# Altium footprint library 04.连接器件.pcb.PCBLIB: 363 footprints (part 15 of 23)
Each footprint in its own frame and in the unit in brackets; x right, y up, seen from the top. Pads: shape width x height; smd on the part's side, far side on the other; paste and mask are expansions set on the pad; w line width, h text height; cw(c..) or ccw(c..) is an arc to the next point about the centre after c.
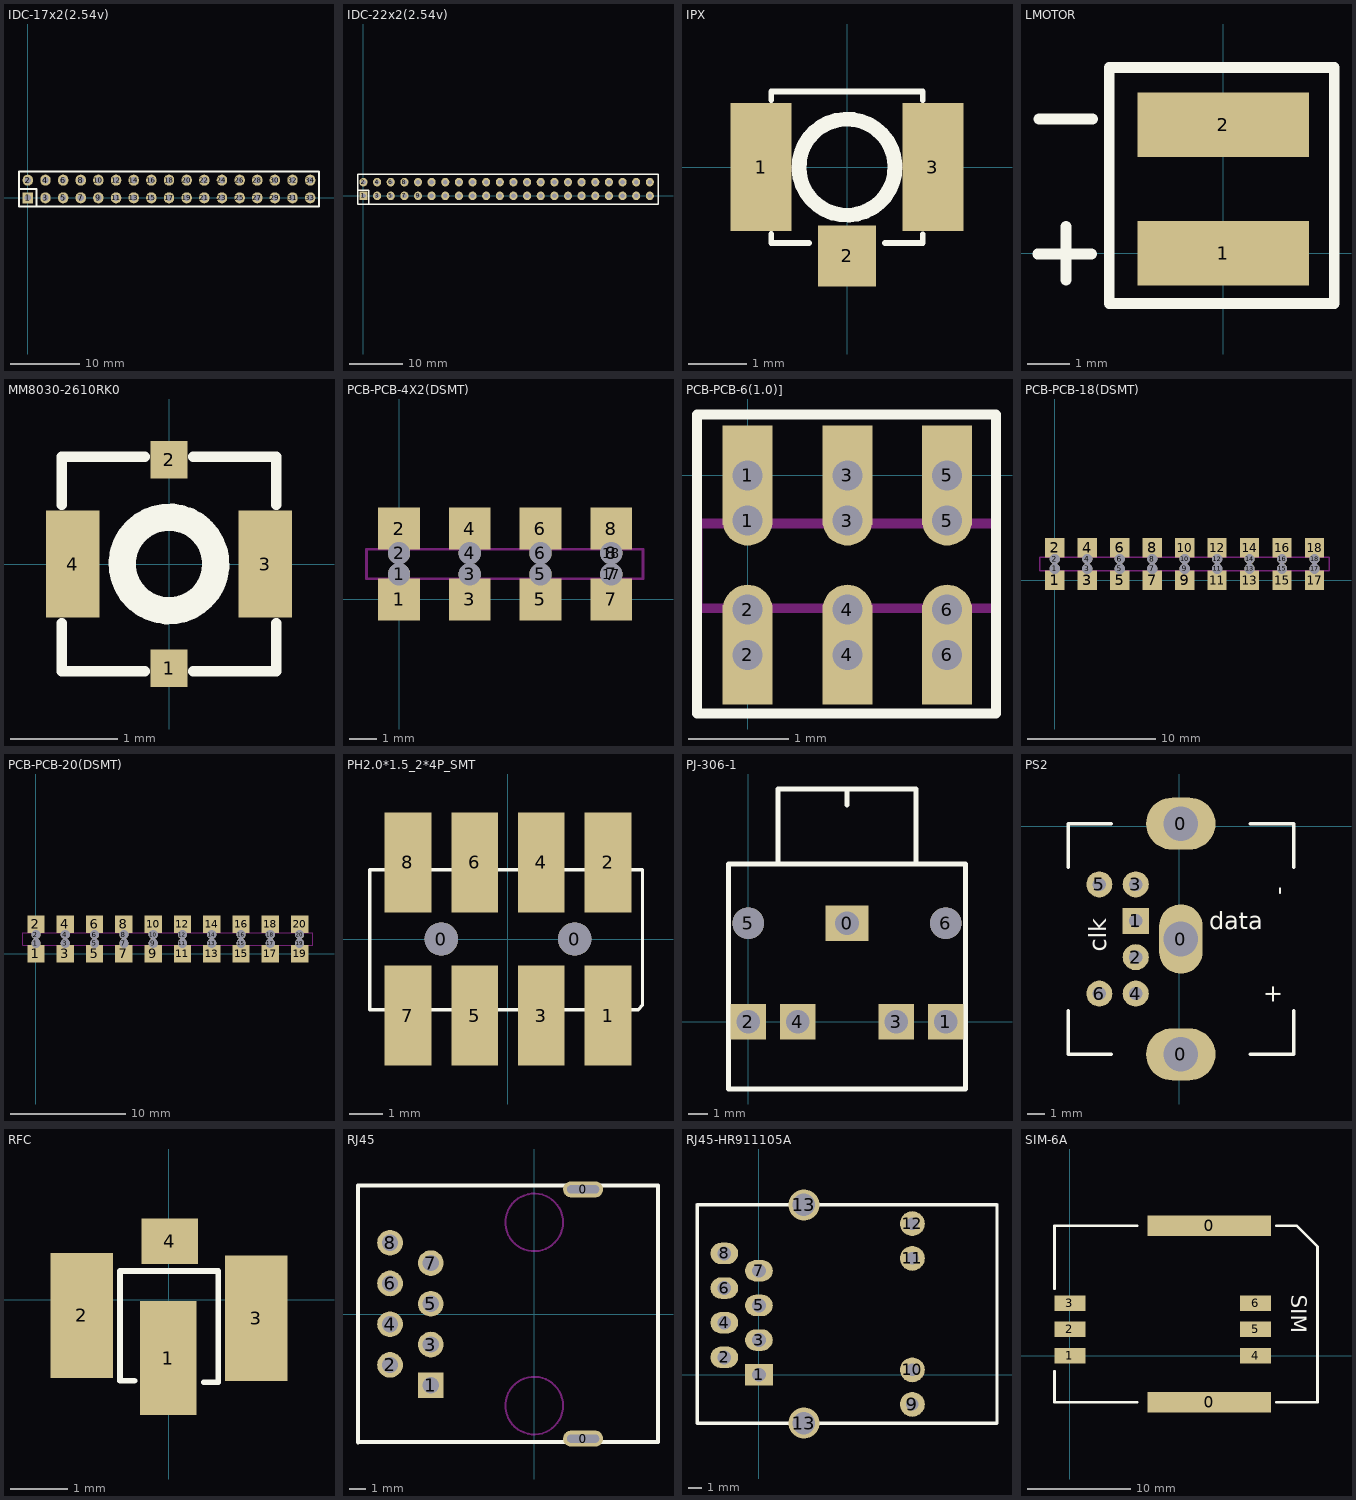
[diagram p14: the footprints below, top view; thin cyan lines are the x and y axes]

## IDC-17x2(2.54v) [mm]
pads (34):
  rect 1.5x1.6 hole 0.9: 1(0,0)
  oval 1.5x1.6 hole 0.9: 2(0,2.54) 3(2.54,0) 4(2.54,2.54) 5(5.08,0) 6(5.08,2.54) 7(7.62,0) 8(7.62,2.54) 9(10.16,0) 10(10.16,2.54) 11(12.7,0) 12(12.7,2.54) 13(15.24,0) 14(15.24,2.54) 15(17.78,0) 16(17.78,2.54) 17(20.32,0) 18(20.32,2.54) 19(22.86,0) 20(22.86,2.54) 21(25.4,0) 22(25.4,2.54) 23(27.94,0) 24(27.94,2.54) 25(30.48,0) 26(30.48,2.54) 27(33.02,0) 28(33.02,2.54) 29(35.56,0) 30(35.56,2.54) 31(38.1,0) 32(38.1,2.54) 33(40.64,0) 34(40.64,2.54)
TopOverlay:
  lines w0.305: -1.27,1.27 1.27,1.27 1.27,-1.27 ; -1.27,-1.27 41.91,-1.27 41.91,3.81 -1.27,3.81 -1.27,-1.27

## IDC-22x2(2.54v) [mm]
pads (44):
  rect 1.5x1.6 hole 0.9: 1(0,0)
  oval 1.5x1.6 hole 0.9: 2(0,2.54) 3(2.54,0) 4(2.54,2.54) 5(5.08,0) 6(5.08,2.54) 7(7.62,0) 8(7.62,2.54) 9(10.16,0) 10(10.16,2.54) 11(12.7,0) 12(12.7,2.54) 13(15.24,0) 14(15.24,2.54) 15(17.78,0) 16(17.78,2.54) 17(20.32,0) 18(20.32,2.54) 19(22.86,0) 20(22.86,2.54) 21(25.4,0) 22(25.4,2.54) 23(27.94,0) 24(27.94,2.54) 25(30.48,0) 26(30.48,2.54) 27(33.02,0) 28(33.02,2.54) 29(35.56,0) 30(35.56,2.54) 31(38.1,0) 32(38.1,2.54) 33(40.64,0) 34(40.64,2.54) 35(43.18,0) 36(43.18,2.54) 37(45.72,0) 38(45.72,2.54) 39(48.26,0) 40(48.26,2.54) 41(50.8,0) 42(50.8,2.54) 43(53.34,0) 44(53.34,2.54)
TopOverlay:
  lines w0.254: -1.016,1.016 1.016,1.016 ; -1.016,-1.524 54.864,-1.524 54.864,3.556 54.864,4.064 -1.016,4.064 -1.016,-1.524
  lines w0.305: 1.016,-1.524 1.016,1.016

## IPX [mm]
pads (3):
  rect 1.05x2.2 smd: 1(-1.475,0) 3(1.475,0)
  rect 1x1.05 smd: 2(0,-1.525)
TopOverlay:
  lines w0.1: -1.3,-1.15 -1.3,-1.3 -0.65,-1.3 ; -1.3,1.151 -1.3,1.3 1.3,1.3 1.3,1.15 ; 0.65,-1.3 1.3,-1.3 1.3,-1.151
  lines w0.254: 0.824,0.029 cw(c0,0) 0.824,0.042

## LMOTOR [mm]
pads (2):
  rect 4x1.5 smd: 1(0,0) 2(0,3)
TopOverlay:
  lines w0.254: -4.323,-0.016 -3.073,-0.016 ; -4.298,3.134 -3.048,3.134 ; -3.662,-0.624 -3.662,0.626 ; -2.656,-1.168 2.594,-1.168 2.594,4.332 -2.656,4.332 -2.656,4.082 -2.656,-1.168

## MM8030-2610RK0 [mm] "蓝牙卡扣MM8030-2610RK0"
pads (4):
  rect 0.35x0.35 smd: 1(0,-0.975) 2(0,0.975)
  rect 0.5x1 smd: 3(0.9,0) 4(-0.9,0)
TopOverlay:
  lines w0.1: -1,-0.552 -1,-1 -0.225,-1 ; -1,0.554 -1,1 -0.226,1 ; 0.226,1 1,1 1,0.553 ; 0.227,-1 1,-1 1,-0.552
  lines w0.254: -0.427,0.093 ccw(c0,0) -0.422,0.112

## PCB-PCB-4X2(DSMT) [mm]
pads (18):
  rect 1.5x1.5 all layers, no hole: 1(0,0) 2(0,2.54) 3(2.54,0) 4(2.54,2.54) 5(5.08,0) 6(5.08,2.54) 7(7.62,0) 8(7.62,2.54)
  round 0.8 hole 0.8: 1(0,0.9) 2(0,1.66) 3(2.54,0.9) 4(2.54,1.66) 5(5.08,0.9) 6(5.08,1.66) 7(7.62,0.9) 8(7.62,1.66) 17(7.62,0.9) 18(7.62,1.66)
BottomOverlay:
  lines w0.1: -1.473,-1.27 9.3,-1.27 9.3,3.81 -1.473,3.81 -1.473,-1.27
KeepOutLayer:
  lines w0.1: -0.914,1.803 8.255,1.803 ; -0.889,0.737 8.331,0.737 ; -0.025,0.737 -1.168,0.737 -1.168,1.803 -0.025,1.803 ; 7.62,0.737 8.763,0.737 8.763,1.803 7.62,1.803

## PCB-PCB-6(1.0)] [mm]
pads (12):
  round 0.5 hole 0.3: 1(0,-0.454) 2(0,-1.346) 3(1,-0.454) 4(1,-1.346) 5(2,-0.454) 6(2,-1.346)
  rect 0.5x1 hole 0.3: 1(0,0) 2(0,-1.8) 3(1,0) 4(1,-1.8) 5(2,0) 6(2,-1.8)
TopOverlay:
  lines w0.1: -0.508,-2.388 2.489,-2.388 2.489,0.61 -0.508,0.61 -0.508,-2.388
KeepOutLayer:
  lines w0.1: 2.489,-1.333 -0.503,-1.333 -0.503,-0.483 2.489,-0.483 ; 2.489,-1.321 2.489,-0.471

## PCB-PCB-18(DSMT) [mm]
pads (36):
  rect 1.5x1.5 all layers, no hole: 1(0,0) 2(0,2.54) 3(2.54,0) 4(2.54,2.54) 5(5.08,0) 6(5.08,2.54) 7(7.62,0) 8(7.62,2.54) 9(10.16,0) 10(10.16,2.54) 11(12.7,0) 12(12.7,2.54) 13(15.24,0) 14(15.24,2.54) 15(17.78,0) 16(17.78,2.54) 17(20.32,0) 18(20.32,2.54)
  round 0.8 hole 0.8: 1(0,0.9) 2(0,1.66) 3(2.54,0.9) 4(2.54,1.66) 5(5.08,0.9) 6(5.08,1.66) 7(7.62,0.9) 8(7.62,1.66) 9(10.16,0.9) 10(10.16,1.66) 11(12.7,0.9) 12(12.7,1.66) 13(15.24,0.9) 14(15.24,1.66) 15(17.78,0.9) 16(17.78,1.66) 17(20.32,0.9) 18(20.32,1.66)
BottomOverlay:
  lines w0.2: -1.473,-1.27 22,-1.27 22,3.81 -1.473,3.81 -1.473,-1.27
KeepOutLayer:
  lines w0.1: -1.168,0.737 -0.025,0.737 20.32,0.737 21.463,0.737 21.463,1.803 20.32,1.803 -0.025,1.803 -1.168,1.803 -1.168,0.737

## PCB-PCB-20(DSMT) [mm]
pads (40):
  rect 1.5x1.5 all layers, no hole: 1(0,0) 2(0,2.54) 3(2.54,0) 4(2.54,2.54) 5(5.08,0) 6(5.08,2.54) 7(7.62,0) 8(7.62,2.54) 9(10.16,0) 10(10.16,2.54) 11(12.7,0) 12(12.7,2.54) 13(15.24,0) 14(15.24,2.54) 15(17.78,0) 16(17.78,2.54) 17(20.32,0) 18(20.32,2.54) 19(22.86,0) 20(22.86,2.54)
  round 0.8 hole 0.8: 1(0,0.9) 2(0,1.66) 3(2.54,0.9) 4(2.54,1.66) 5(5.08,0.9) 6(5.08,1.66) 7(7.62,0.9) 8(7.62,1.66) 9(10.16,0.9) 10(10.16,1.66) 11(12.7,0.9) 12(12.7,1.66) 13(15.24,0.9) 14(15.24,1.66) 15(17.78,0.9) 16(17.78,1.66) 17(20.32,0.9) 18(20.32,1.66) 19(22.86,0.9) 20(22.86,1.66)
BottomOverlay:
  lines w0.2: -1.473,-1.27 24.54,-1.27 24.54,3.81 -1.473,3.81 -1.473,-1.27
KeepOutLayer:
  lines w0.1: -1.168,0.737 -1.168,1.803 2.515,1.803 22.86,1.803 24.003,1.803 24.003,0.737 22.86,0.737 -0.025,0.737 -1.168,0.737

## PH2.0*1.5_2*4P_SMT [mm] "HP2.0*1.5_2*4P_SMT_DA=3.2_DB=2.0_带定位柱_展开6.5"
pads (10):
  round 1 hole 1 unplated: 0(-2,0) 0(2,0)
  rect 1.4x3 smd: 1(3,-2.3) 2(3,2.3) 3(1,-2.3) 4(1,2.3) 5(-1,-2.3) 6(-1,2.3) 7(-3,-2.3) 8(-3,2.3)
TopOverlay:
  lines w0.1: 3.913,-2.118 -4.143,-2.118 -4.143,2.073 4.036,2.073 4.036,-1.994 ; 3.919,-2.107 4.033,-1.992
3D body "asm0001_asm.stp": height 5.2, standoff -0.7, extent -4.009,-3.266 3.99,3.234

## PJ-306-1 [mm]
pads (7):
  rect 2.2x1.8 hole 1.2: 0(5,5)
  rect 1.8x1.8 hole 1.2: 1(10,0) 2(0,0) 3(7.5,0) 4(2.5,0)
  round 1.6 hole 1.6 unplated: 5(0,5) 6(10,5)
TopOverlay:
  lines w0.254: 1.5,8 1.5,11.8 8.4,11.8 ; 5,11 5,11.8 ; 8.5,8 8.5,11.8 ; -1,-3.4 -1,8 11,8 11,-3.4 -1,-3.4
3D body "耳机.": height 3.2, standoff -10.8, extent -1.041,-3.689 11.059,11.411

## PS2 [mm]
pads (9):
  oval 4x3 hole 2: 0(0.092,-13.162) 0(0.092,0.138)
  oval 2.5x4 hole 2: 0(0.092,-6.512)
  rect 1.5x1.5 hole 0.762: 1(-2.508,-5.462)
  round 1.5 hole 0.762: 2(-2.508,-7.562) 3(-2.508,-3.362) 4(-2.508,-9.662) 5(-4.608,-3.362) 6(-4.608,-9.662)
TopOverlay:
  lines w0.2: -6.41,-10.662 -6.41,-13.162 -3.91,-13.162 ; -6.409,-2.363 -6.409,0.137 -3.909,0.137 ; 4.094,-13.161 6.593,-13.162 6.594,-10.661 ; 4.095,0.139 6.595,0.139 6.595,-2.361
  text "data" at 1.744,-5.937 h1
  text "+" at 5.851,-10.27 h1
  text "-" at 6.19,-3.978 h1
  text "clk" at -4.208,-7.256 h1

## RFC [mm]
pads (4):
  rect 1x2 smd: 1(-0.012,-1.025)
  rect 1.1x2.2 smd: 2(-1.537,-0.275) 3(1.538,-0.325)
  rect 1x0.8 smd: 4(0.013,1.025)
TopOverlay:
  lines w0.1: -0.607,-1.425 -0.861,-1.425 -0.861,0.505 0.866,0.505 0.866,-1.45 0.612,-1.45

## RJ45 [mm] "无LED，无变压器，带屏蔽壳"
pads (10):
  oval 2.5x1 hole 0.5 slot 2 at 0 deg: 0(3.05,-7.775) 0(3.05,7.775)
  rect 1.6x1.6 hole 1.016: 1(-6.45,-4.445)
  round 1.6 hole 1.016: 2(-8.99,-3.175) 3(-6.45,-1.905) 4(-8.99,-0.635) 5(-6.45,0.635) 6(-8.99,1.905) 7(-6.45,3.175) 8(-8.99,4.445)
TopOverlay:
  lines w0.254: -10.99,-8.001 -10.984,-7.995 ; -10.99,8.001 -10.986,8.005 ; -10.986,8.005 -3.15,8.005 7.722,8.005 7.722,-7.995 -3.15,-7.995 -10.984,-7.995 ; -10.986,8.005 -10.986,-7.993 -10.984,-7.995
KeepOutLayer:
  circle w0.127: c0,-5.715 r1.798
  circle w0.127: c0,5.715 r1.798
3D body "RJ45无变压器1x1(": height 13.1, standoff -3.3, extent -10.776,-7.826 7.474,7.874

## RJ45-HR911105A [mil] "HR911105A 一体式网线接口"
pads (14):
  rect 80x62 hole 40: 1(0,0)
  oval 80x62 hole 40: 2(-100,50) 3(0,100) 4(-100,150) 5(0,200) 6(-100,250) 7(0,300) 8(-100,350)
  round 72 hole 36: 9(442.91,-85.63) 10(442.91,14) 11(442.91,335.87) 12(442.91,436)
  round 90 hole 65: 13(129.92,-139.76) 13(129.92,490.16)
TopOverlay:
  lines w10: -178.74,-140 -178.5,-139.76 ; -178.74,490 -178.58,490.16 ; -178.58,490.16 -178.58,-139.69 -178.5,-139.76 ; -178.58,490.16 129.92,490.16 687.24,490.16 687.4,490 687.4,-140 687.17,-139.76 129.92,-139.76 -178.5,-139.76
MultiLayer:
  circle w5: c260,400 r70.8
  circle w5: c260,-50 r70.8

## SIM-6A [mm]
pads (8):
  rect 12x2 smd: 0(13.5,-4.5) 0(13.5,12.58)
  rect 3x1.5 smd: 1(0,0) 2(0,2.54) 3(0,5.08) 4(18,0) 5(18,2.54) 6(18,5.08)
TopOverlay:
  lines w0.254: -1.5,-1.5 -1.5,-4.5 6.5,-4.5 ; -1.5,6.5 -1.5,12.58 6.5,12.58 ; 20,12.58 22,12.58 24,10.58 24,-4.5 20.016,-4.5
  text "SIM" at 21.446,5.91 h1.52